# Altium footprint library MU_MP_39_V1.PcbLib: 76 footprints (part 2 of 5)
Each footprint in its own frame and in the unit in brackets; x right, y up, seen from the top. Pads: shape width x height; smd on the part's side, far side on the other; paste and mask are expansions set on the pad; w line width, h text height; cw(c..) or ccw(c..) is an arc to the next point about the centre after c.
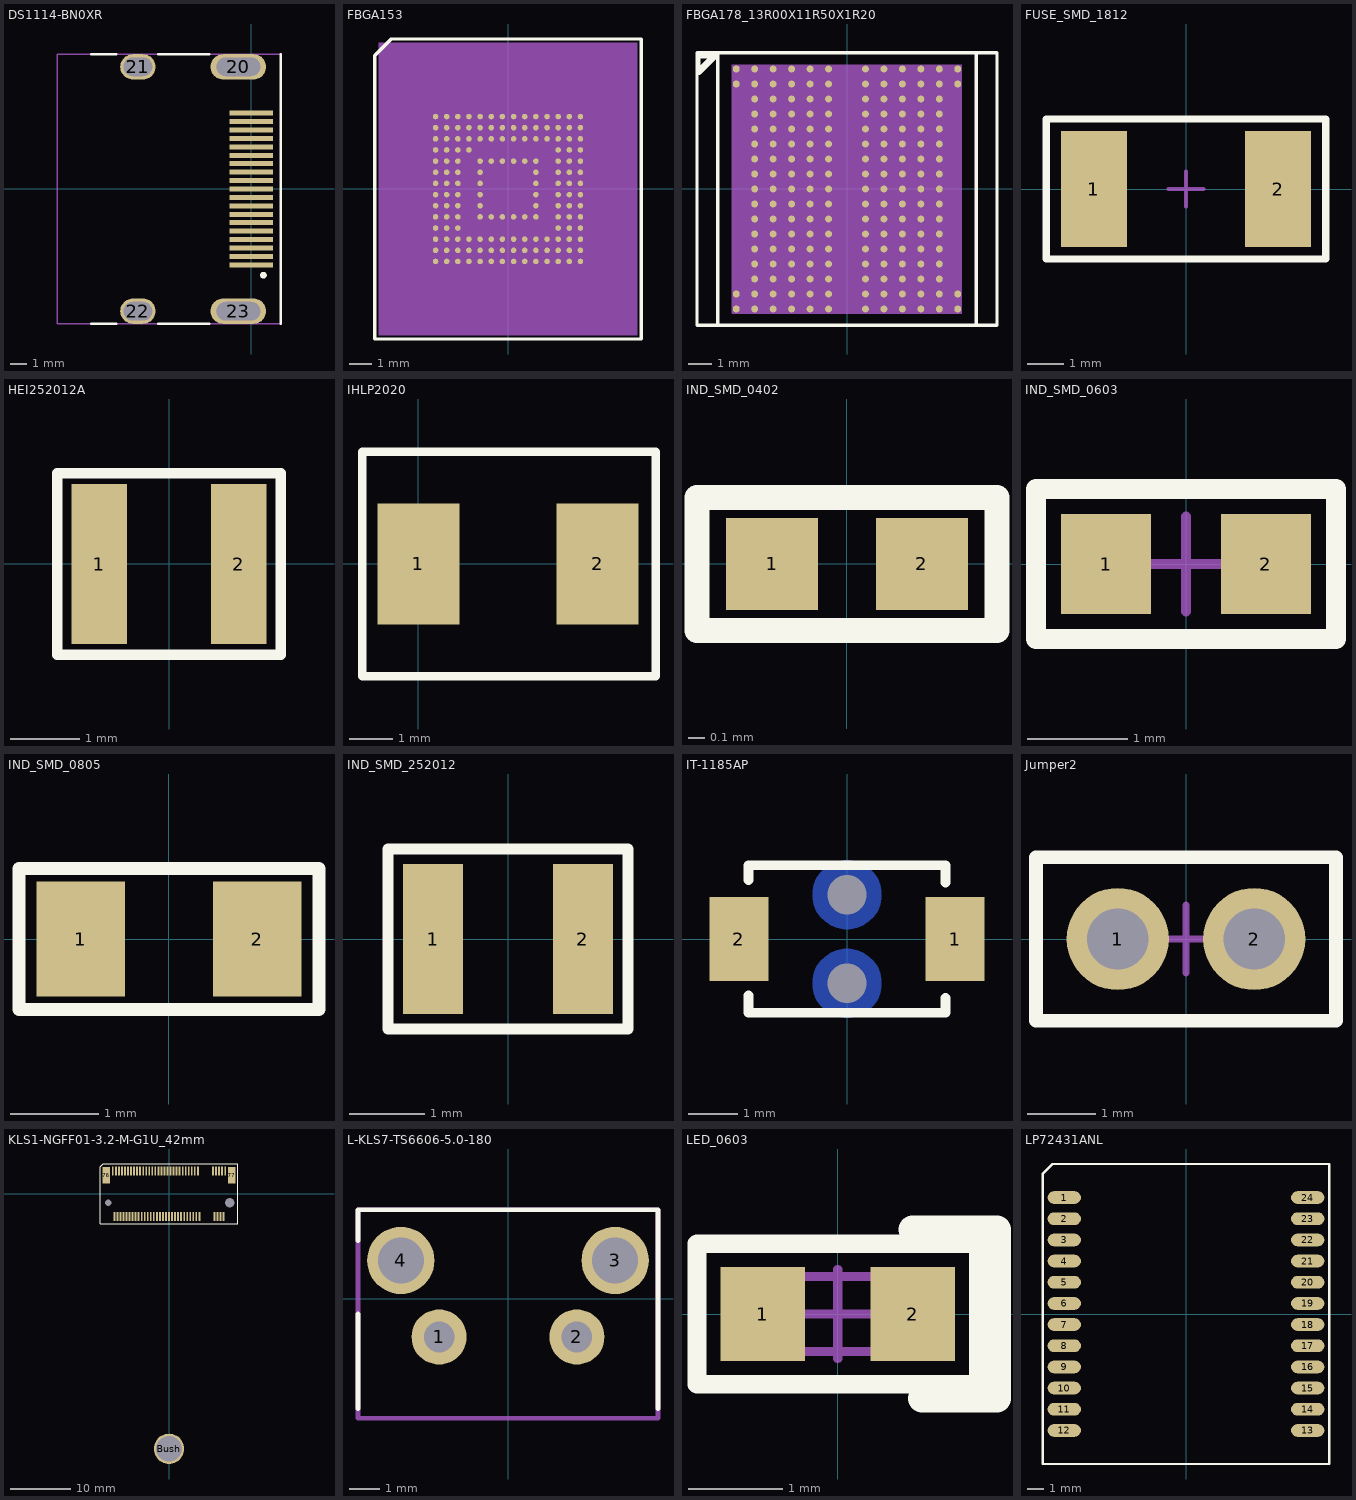
[diagram p1: the footprints below, top view; thin cyan lines are the x and y axes]

## DS1114-BN0XR [mm]
pads (23):
  rect 2.6x0.3 smd: 1(0,-4.5) 2(0,-4) 3(0,-3.5) 4(0,-3) 5(0,-2.5) 6(0,-2) 7(0,-1.5) 8(0,-1) 9(0,-0.5) 10(0,0) 11(0,0.5) 12(0,1) 13(0,1.5) 14(0,2) 15(0,2.5) 16(0,3) 17(0,3.5) 18(0,4) 19(0,4.5)
  oval 3.3x1.5 hole 1.1 slot 2.6 at 0 deg: 20(-0.76,7.25) 23(-0.76,-7.25)
  oval 2.1x1.5 hole 1.1 slot 1.7 at 0 deg: 21(-6.72,7.25) 22(-6.72,-7.25)
Top Overlay:
  circle w0.2: c0.725,-5.115 r0.1
  lines w0.15: -9.5,-8 -8,-8 ; -9.5,8 -8,8 ; -5.5,-8 -2.5,-8 ; -5.5,8 -2.5,8 ; 1.75,-8 1.75,8
Top Solder:
  rectangle: -1.4,-4.715 1.4,4.7
Mechanical 15:
  lines w0.1: -11.5,-8 -11.5,8 1.75,8 1.75,-8 -11.5,-8
3D body "HDMI.STEP": height 6.23, standoff -2.15, extent -11.325,-7.5 0.825,7.5

## FBGA153 [mm]
pads (153):
  round 0.25 smd: A1(-3.25,3.25) A2(-2.75,3.25) A3(-2.25,3.25) A4(-1.75,3.25) A5(-1.25,3.25) A6(-0.75,3.25) A7(-0.25,3.25) A8(0.25,3.25) A9(0.75,3.25) A10(1.25,3.25) A11(1.75,3.25) A12(2.25,3.25) A13(2.75,3.25) A14(3.25,3.25) B1(-3.25,2.75) B2(-2.75,2.75) B3(-2.25,2.75) B4(-1.75,2.75) B5(-1.25,2.75) B6(-0.75,2.75) B7(-0.25,2.75) B8(0.25,2.75) B9(0.75,2.75) B10(1.25,2.75) B11(1.75,2.75) B12(2.25,2.75) B13(2.75,2.75) B14(3.25,2.75) C1(-3.25,2.25) C2(-2.75,2.25) C3(-2.25,2.25) C4(-1.75,2.25) C5(-1.25,2.25) C6(-0.75,2.25) C7(-0.25,2.25) C8(0.25,2.25) C9(0.75,2.25) C10(1.25,2.25) C11(1.75,2.25) C12(2.25,2.25) C13(2.75,2.25) C14(3.25,2.25) D1(-3.25,1.75) D2(-2.75,1.75) D3(-2.25,1.75) D4(-1.75,1.75) D12(2.25,1.75) D13(2.75,1.75) D14(3.25,1.75) E1(-3.25,1.25) E2(-2.75,1.25) E3(-2.25,1.25) E5(-1.25,1.25) E6(-0.75,1.25) E7(-0.25,1.25) E8(0.25,1.25) E9(0.75,1.25) E10(1.25,1.25) E12(2.25,1.25) E13(2.75,1.25) E14(3.25,1.25) F1(-3.25,0.75) F2(-2.75,0.75) F3(-2.25,0.75) F5(-1.25,0.75) F10(1.25,0.75) F12(2.25,0.75) F13(2.75,0.75) F14(3.25,0.75) G1(-3.25,0.25) G2(-2.75,0.25) G3(-2.25,0.25) G5(-1.25,0.25) G10(1.25,0.25) G12(2.25,0.25) G13(2.75,0.25) G14(3.25,0.25) H1(-3.25,-0.25) H2(-2.75,-0.25) H3(-2.25,-0.25) H5(-1.25,-0.25) H10(1.25,-0.25) H12(2.25,-0.25) H13(2.75,-0.25) H14(3.25,-0.25) J1(-3.25,-0.75) J2(-2.75,-0.75) J3(-2.25,-0.75) J5(-1.25,-0.75) J10(1.25,-0.75) J12(2.25,-0.75) J13(2.75,-0.75) J14(3.25,-0.75) K1(-3.25,-1.25) K2(-2.75,-1.25) K3(-2.25,-1.25) K5(-1.25,-1.25) K6(-0.75,-1.25) K7(-0.25,-1.25) K8(0.25,-1.25) K9(0.75,-1.25) K10(1.25,-1.25) K12(2.25,-1.25) K13(2.75,-1.25) K14(3.25,-1.25) L1(-3.25,-1.75) L2(-2.75,-1.75) L3(-2.25,-1.75) L12(2.25,-1.75) L13(2.75,-1.75) L14(3.25,-1.75) M1(-3.25,-2.25) M2(-2.75,-2.25) M3(-2.25,-2.25) M4(-1.75,-2.25) M5(-1.25,-2.25) M6(-0.75,-2.25) M7(-0.25,-2.25) M8(0.25,-2.25) M9(0.75,-2.25) M10(1.25,-2.25) M11(1.75,-2.25) M12(2.25,-2.25) M13(2.75,-2.25) M14(3.25,-2.25) N1(-3.25,-2.75) N2(-2.75,-2.75) N3(-2.25,-2.75) N4(-1.75,-2.75) N5(-1.25,-2.75) N6(-0.75,-2.75) N7(-0.25,-2.75) N8(0.25,-2.75) N9(0.75,-2.75) N10(1.25,-2.75) N11(1.75,-2.75) N12(2.25,-2.75) N13(2.75,-2.75) N14(3.25,-2.75) P1(-3.25,-3.25) P2(-2.75,-3.25) P3(-2.25,-3.25) P4(-1.75,-3.25) P5(-1.25,-3.25) P6(-0.75,-3.25) P7(-0.25,-3.25) P8(0.25,-3.25) P9(0.75,-3.25) P10(1.25,-3.25) P11(1.75,-3.25) P12(2.25,-3.25) P13(2.75,-3.25) P14(3.25,-3.25)
Top Overlay:
  lines w0.152: -5.978,-6.728 5.978,-6.728 5.978,6.599 5.978,6.728 -5.238,6.728 -5.978,5.989 -5.978,-6.728
Mechanical 5:
  dashed: -5.8,-6.55 5.8,-6.55 5.8,6.55 -5.8,6.55
Mechanical 30:
  text "J5" at -1.047,-0.75 h0.7
  text "H5" at -1.047,-0.25 h0.7
  text "A6" at -0.547,3.25 h0.7
  text "B2" at -2.547,2.75 h0.7
  text "C6" at -0.547,2.25 h0.7
  text "P5" at -1.047,-3.25 h0.7
  text "P3" at -2.047,-3.25 h0.7
  text "M4" at -1.547,-2.25 h0.7
  text "N4" at -1.547,-2.75 h0.7
  text "B4" at -1.547,2.75 h0.7
  text "K5" at -1.047,-1.25 h0.7
  text "A4" at -1.547,3.25 h0.7
  text "A5" at -1.047,3.25 h0.7
  text "A3" at -2.047,3.25 h0.7
  text "B6" at -0.547,2.75 h0.7
  text "K9" at 0.953,-1.25 h0.7
  text "J10" at 1.555,-0.75 h0.7
  text "F5" at -1.047,0.75 h0.7
  text "E6" at -0.547,1.25 h0.7
  text "B3" at -2.047,2.75 h0.7
  text "B5" at -1.047,2.75 h0.7
  text "C2" at -2.547,2.25 h0.7
  text "M5" at -1.047,-2.25 h0.7
  text "M6" at -0.547,-2.25 h0.7
  text "A1" at -3.047,3.25 h0.7
  text "A10" at 1.555,3.25 h0.7
  text "A11" at 2.055,3.25 h0.7
  text "A12" at 2.555,3.25 h0.7
  text "A13" at 3.055,3.25 h0.7
  text "A14" at 3.555,3.25 h0.7
  text "A2" at -2.547,3.25 h0.7
  text "A8" at 0.453,3.25 h0.7
  text "A9" at 0.953,3.25 h0.7
  text "B1" at -3.047,2.75 h0.7
  text "B10" at 1.555,2.75 h0.7
  text "B11" at 2.055,2.75 h0.7
  text "B12" at 2.555,2.75 h0.7
  text "B13" at 3.055,2.75 h0.7
  text "B14" at 3.555,2.75 h0.7
  text "B7" at -0.047,2.75 h0.7
  text "B8" at 0.453,2.75 h0.7
  text "B9" at 0.953,2.75 h0.7
  text "C1" at -3.047,2.25 h0.7
  text "C10" at 1.555,2.25 h0.7
  text "C11" at 2.055,2.25 h0.7
  text "C12" at 2.555,2.25 h0.7
  text "C13" at 3.055,2.25 h0.7
  text "C14" at 3.555,2.25 h0.7
  text "C3" at -2.047,2.25 h0.7
  text "C7" at -0.047,2.25 h0.7
  text "C8" at 0.453,2.25 h0.7
  text "C9" at 0.953,2.25 h0.7
  text "D1" at -3.047,1.75 h0.7
  text "D12" at 2.555,1.75 h0.7
  text "D13" at 3.055,1.75 h0.7
  text "D14" at 3.555,1.75 h0.7
  text "D2" at -2.547,1.75 h0.7
  text "D3" at -2.047,1.75 h0.7
  text "D4" at -1.547,1.75 h0.7
  text "E1" at -3.047,1.25 h0.7
  text "E12" at 2.555,1.25 h0.7
  text "E13" at 3.055,1.25 h0.7
  text "E14" at 3.555,1.25 h0.7
  text "E2" at -2.547,1.25 h0.7
  text "E3" at -2.047,1.25 h0.7
  text "F1" at -3.047,0.75 h0.7
  text "F12" at 2.555,0.75 h0.7
  text "F13" at 3.055,0.75 h0.7
  text "F14" at 3.555,0.75 h0.7
  text "F2" at -2.547,0.75 h0.7
  text "F3" at -2.047,0.75 h0.7
  text "G1" at -3.047,0.25 h0.7
  text "G12" at 2.555,0.25 h0.7
  text "G13" at 3.055,0.25 h0.7
  text "G14" at 3.555,0.25 h0.7
  text "G2" at -2.547,0.25 h0.7
  text "H1" at -3.047,-0.25 h0.7
  text "H12" at 2.555,-0.25 h0.7
  text "H13" at 3.055,-0.25 h0.7
  text "H14" at 3.555,-0.25 h0.7
  text "H2" at -2.547,-0.25 h0.7
  text "H3" at -2.047,-0.25 h0.7
  text "J1" at -3.047,-0.75 h0.7
  text "J12" at 2.555,-0.75 h0.7
  text "J13" at 3.055,-0.75 h0.7
  text "J14" at 3.555,-0.75 h0.7
  text "J2" at -2.547,-0.75 h0.7
  text "J3" at -2.047,-0.75 h0.7
  text "K1" at -3.047,-1.25 h0.7
  text "K12" at 2.555,-1.25 h0.7
  text "K13" at 3.055,-1.25 h0.7
  text "K14" at 3.555,-1.25 h0.7
  text "K2" at -2.547,-1.25 h0.7
  text "K3" at -2.047,-1.25 h0.7
  text "L1" at -3.047,-1.75 h0.7
  text "L12" at 2.555,-1.75 h0.7
  text "L13" at 3.055,-1.75 h0.7
  text "L14" at 3.555,-1.75 h0.7
  text "L2" at -2.547,-1.75 h0.7
  text "L3" at -2.047,-1.75 h0.7
  text "M1" at -3.047,-2.25 h0.7
  text "M10" at 1.555,-2.25 h0.7
  text "M11" at 2.055,-2.25 h0.7
  text "M12" at 2.555,-2.25 h0.7
  text "M13" at 3.055,-2.25 h0.7
  text "M14" at 3.555,-2.25 h0.7
  text "M2" at -2.547,-2.25 h0.7
  text "M3" at -2.047,-2.25 h0.7
  text "M7" at -0.047,-2.25 h0.7
  text "M8" at 0.453,-2.25 h0.7
  text "M9" at 0.953,-2.25 h0.7
  text "N1" at -3.047,-2.75 h0.7
  text "N10" at 1.555,-2.75 h0.7
  text "N11" at 2.055,-2.75 h0.7
  text "N12" at 2.555,-2.75 h0.7
  text "N13" at 3.055,-2.75 h0.7
  text "N14" at 3.555,-2.75 h0.7
  text "N3" at -2.047,-2.75 h0.7
  text "N6" at -0.547,-2.75 h0.7
  text "N7" at -0.047,-2.75 h0.7
  text "N8" at 0.453,-2.75 h0.7
  text "N9" at 0.953,-2.75 h0.7
  text "P1" at -3.047,-3.25 h0.7
  text "P11" at 2.055,-3.25 h0.7
  text "P12" at 2.555,-3.25 h0.7
  text "P13" at 3.055,-3.25 h0.7
  text "P14" at 3.555,-3.25 h0.7
  text "P2" at -2.547,-3.25 h0.7
  text "P8" at 0.453,-3.25 h0.7
  text "P9" at 0.953,-3.25 h0.7
  text "G3" at -2.047,0.25 h0.7
  text "K10" at 1.555,-1.25 h0.7
  text "K6" at -0.547,-1.25 h0.7
  text "K7" at -0.047,-1.25 h0.7
  text "P10" at 1.555,-3.25 h0.7
  text "P7" at -0.047,-3.25 h0.7
  text "A7" at -0.047,3.25 h0.7
  text "C5" at -1.047,2.25 h0.7
  text "E10" at 1.555,1.25 h0.7
  text "E5" at -1.047,1.25 h0.7
  text "E8" at 0.453,1.25 h0.7
  text "E9" at 0.953,1.25 h0.7
  text "F10" at 1.555,0.75 h0.7
  text "G10" at 1.555,0.25 h0.7
  text "G5" at -1.047,0.25 h0.7
  text "E7" at -0.047,1.25 h0.7
  text "K8" at 0.453,-1.25 h0.7
  text "H10" at 1.555,-0.25 h0.7
  text "C4" at -1.547,2.25 h0.7
  text "P6" at -0.547,-3.25 h0.7
  text "N5" at -1.047,-2.75 h0.7
  text "P4" at -1.547,-3.25 h0.7
  text "N2" at -2.547,-2.75 h0.7
3D body "User Library-153BallWFBGA.STEP": height 0.78, standoff -0.02, extent -5.75,-6.471 5.75,6.529

## FBGA178_13R00X11R50X1R20 [mm]
pads (178):
  round 0.3 smd: A1(-4.8,5.2) A2(-4,5.2) A3(-3.2,5.2) A4(-2.4,5.2) A5(-1.6,5.2) A6(-0.8,5.2) A8(0.8,5.2) A9(1.6,5.2) A10(2.4,5.2) A11(3.2,5.2) A12(4,5.2) A13(4.8,5.2) B1(-4.8,4.55) B2(-4,4.55) B3(-3.2,4.55) B4(-2.4,4.55) B5(-1.6,4.55) B6(-0.8,4.55) B8(0.8,4.55) B9(1.6,4.55) B10(2.4,4.55) B11(3.2,4.55) B12(4,4.55) B13(4.8,4.55) C2(-4,3.9) C3(-3.2,3.9) C4(-2.4,3.9) C5(-1.6,3.9) C6(-0.8,3.9) C8(0.8,3.9) C9(1.6,3.9) C10(2.4,3.9) C11(3.2,3.9) C12(4,3.9) D2(-4,3.25) D3(-3.2,3.25) D4(-2.4,3.25) D5(-1.6,3.25) D6(-0.8,3.25) D8(0.8,3.25) D9(1.6,3.25) D10(2.4,3.25) D11(3.2,3.25) D12(4,3.25) E2(-4,2.6) E3(-3.2,2.6) E4(-2.4,2.6) E5(-1.6,2.6) E6(-0.8,2.6) E8(0.8,2.6) E9(1.6,2.6) E10(2.4,2.6) E11(3.2,2.6) E12(4,2.6) F2(-4,1.95) F3(-3.2,1.95) F4(-2.4,1.95) F5(-1.6,1.95) F6(-0.8,1.95) F8(0.8,1.95) F9(1.6,1.95) F10(2.4,1.95) F11(3.2,1.95) F12(4,1.95) G2(-4,1.3) G3(-3.2,1.3) G4(-2.4,1.3) G5(-1.6,1.3) G6(-0.8,1.3) G8(0.8,1.3) G9(1.6,1.3) G10(2.4,1.3) G11(3.2,1.3) G12(4,1.3) H2(-4,0.65) H3(-3.2,0.65) H4(-2.4,0.65) H5(-1.6,0.65) H6(-0.8,0.65) H8(0.8,0.65) H9(1.6,0.65) H10(2.4,0.65) H11(3.2,0.65) H12(4,0.65) J2(-4,0) J3(-3.2,0) J4(-2.4,0) J5(-1.6,0) J6(-0.8,0) J8(0.8,0) J9(1.6,0) J10(2.4,0) J11(3.2,0) J12(4,0) K2(-4,-0.65) K3(-3.2,-0.65) K4(-2.4,-0.65) K5(-1.6,-0.65) K6(-0.8,-0.65) K8(0.8,-0.65) K9(1.6,-0.65) K10(2.4,-0.65) K11(3.2,-0.65) K12(4,-0.65) L2(-4,-1.3) L3(-3.2,-1.3) L4(-2.4,-1.3) L5(-1.6,-1.3) L6(-0.8,-1.3) L8(0.8,-1.3) L9(1.6,-1.3) L10(2.4,-1.3) L11(3.2,-1.3) L12(4,-1.3) M2(-4,-1.95) M3(-3.2,-1.95) M4(-2.4,-1.95) M5(-1.6,-1.95) M6(-0.8,-1.95) M8(0.8,-1.95) M9(1.6,-1.95) M10(2.4,-1.95) M11(3.2,-1.95) M12(4,-1.95) N2(-4,-2.6) N3(-3.2,-2.6) N4(-2.4,-2.6) N5(-1.6,-2.6) N6(-0.8,-2.6) N8(0.8,-2.6) N9(1.6,-2.6) N10(2.4,-2.6) N11(3.2,-2.6) N12(4,-2.6) P2(-4,-3.25) P3(-3.2,-3.25) P4(-2.4,-3.25) P5(-1.6,-3.25) P6(-0.8,-3.25) P8(0.8,-3.25) P9(1.6,-3.25) P10(2.4,-3.25) P11(3.2,-3.25) P12(4,-3.25) R2(-4,-3.9) R3(-3.2,-3.9) R4(-2.4,-3.9) R5(-1.6,-3.9) R6(-0.8,-3.9) R8(0.8,-3.9) R9(1.6,-3.9) R10(2.4,-3.9) R11(3.2,-3.9) R12(4,-3.9) T1(-4.8,-4.55) T2(-4,-4.55) T3(-3.2,-4.55) T4(-2.4,-4.55) T5(-1.6,-4.55) T6(-0.8,-4.55) T8(0.8,-4.55) T9(1.6,-4.55) T10(2.4,-4.55) T11(3.2,-4.55) T12(4,-4.55) T13(4.8,-4.55) U1(-4.8,-5.2) U2(-4,-5.2) U3(-3.2,-5.2) U4(-2.4,-5.2) U5(-1.6,-5.2) U6(-0.8,-5.2) U8(0.8,-5.2) U9(1.6,-5.2) U10(2.4,-5.2) U11(3.2,-5.2) U12(4,-5.2) U13(4.8,-5.2)
Top Overlay:
  lines w0.15: -6.416,5.084 -6.416,5.632 ; -5.6,-5.9 -5.6,5.9 ; 5.6,-5.9 5.6,5.9 ; -6.5,-5.9 -6.5,5.9 6.5,5.9 6.5,-5.9 -6.5,-5.9
  lines w0.3: -6.416,5.084 -5.7,5.8 -6.411,5.8
Mechanical 7:
  text "D10" at 2.4,4.012 h0.7
  text "D11" at 3.2,4.012 h0.7
  text "P10" at 2.4,-2.488 h0.7
  text "P11" at 3.2,-2.488 h0.7
  text "G10" at 2.4,2.062 h0.7
  text "G11" at 3.2,2.062 h0.7
  text "L10" at 2.4,-0.538 h0.7
  text "L11" at 3.2,-0.538 h0.7
  text "D8" at 0.8,3.758 h0.7
  text "P8" at 0.8,-2.742 h0.7
  text "G8" at 0.8,1.808 h0.7
  text "L8" at 0.8,-0.792 h0.7
  text "F10" at 2.4,2.712 h0.7
  text "F11" at 3.2,2.712 h0.7
  text "M11" at 3.2,-1.188 h0.7
  text "M10" at 2.4,-1.188 h0.7
  text "M9" at 1.6,-1.442 h0.7
  text "M8" at 0.8,-1.442 h0.7
  text "B8" at 0.8,5.058 h0.7
  text "B9" at 1.6,5.058 h0.7
  text "N11" at 3.2,-1.838 h0.7
  text "B10" at 2.4,5.312 h0.7
  text "B11" at 3.2,5.312 h0.7
  text "C8" at 0.8,4.408 h0.7
  text "C9" at 1.6,4.408 h0.7
  text "C10" at 2.4,4.662 h0.7
  text "C11" at 3.2,4.662 h0.7
  text "R11" at 3.2,-3.138 h0.7
  text "R10" at 2.4,-3.138 h0.7
  text "R9" at 1.6,-3.392 h0.7
  text "R8" at 0.8,-3.392 h0.7
  text "N10" at 2.4,-1.838 h0.7
  text "T11" at 3.2,-3.788 h0.7
  text "T9" at 1.6,-4.042 h0.7
  text "D9" at 1.6,3.758 h0.7
  text "E9" at 1.6,3.108 h0.7
  text "E10" at 2.4,3.362 h0.7
  text "E11" at 3.2,3.362 h0.7
  text "F8" at 0.8,2.458 h0.7
  text "F9" at 1.6,2.458 h0.7
  text "N9" at 1.6,-2.092 h0.7
  text "P9" at 1.6,-2.742 h0.7
  text "C2" at -4,4.408 h0.7
  text "D2" at -4,3.758 h0.7
  text "E2" at -4,3.108 h0.7
  text "E3" at -3.2,3.108 h0.7
  text "F3" at -3.2,2.458 h0.7
  text "N3" at -3.2,-2.092 h0.7
  text "N2" at -4,-2.092 h0.7
  text "P2" at -4,-2.742 h0.7
  text "R2" at -4,-3.392 h0.7
  text "T10" at 2.4,-3.788 h0.7
  text "T8" at 0.8,-4.042 h0.7
  text "J8" at 0.8,0.508 h0.7
  text "L4" at -2.4,-0.792 h0.7
  text "L3" at -3.2,-0.792 h0.7
  text "K4" at -2.4,-0.142 h0.7
  text "K3" at -3.2,-0.142 h0.7
  text "M3" at -3.2,-1.442 h0.7
  text "J11" at 3.2,0.762 h0.7
  text "T12" at 4,-3.788 h0.7
  text "B12" at 4,5.312 h0.7
  text "D12" at 4,4.012 h0.7
  text "J12" at 4,0.762 h0.7
  text "M12" at 4,-1.188 h0.7
  text "T2" at -4,-4.042 h0.7
  text "H2" at -4,1.158 h0.7
  text "P12" at 4,-2.488 h0.7
  text "F12" at 4,2.712 h0.7
  text "K10" at 2.4,0.112 h0.7
  text "L9" at 1.6,-0.792 h0.7
  text "R6" at -0.8,-3.392 h0.7
  text "T3" at -3.2,-4.042 h0.7
  text "T6" at -0.8,-4.042 h0.7
  text "R4" at -2.4,-3.392 h0.7
  text "T4" at -2.4,-4.042 h0.7
  text "T5" at -1.6,-4.042 h0.7
  text "R5" at -1.6,-3.392 h0.7
  text "K2" at -4,-0.142 h0.7
  text "J4" at -2.4,0.508 h0.7
  text "C5" at -1.6,4.408 h0.7
  text "B5" at -1.6,5.058 h0.7
  text "B6" at -0.8,5.058 h0.7
  text "C6" at -0.8,4.408 h0.7
  text "H10" at 2.4,1.412 h0.7
  text "G9" at 1.6,1.808 h0.7
  text "E6" at -0.8,3.108 h0.7
  text "G6" at -0.8,1.808 h0.7
  text "F6" at -0.8,2.458 h0.7
  text "F4" at -2.4,2.458 h0.7
  text "E4" at -2.4,3.108 h0.7
  text "G4" at -2.4,1.808 h0.7
  text "G3" at -3.2,1.808 h0.7
  text "C3" at -3.2,4.408 h0.7
  text "D3" at -3.2,3.758 h0.7
  text "B2" at -4,5.058 h0.7
  text "F5" at -1.6,2.458 h0.7
  text "E5" at -1.6,3.108 h0.7
  text "M6" at -0.8,-1.442 h0.7
  text "N6" at -0.8,-2.092 h0.7
  text "L6" at -0.8,-0.792 h0.7
  text "M5" at -1.6,-1.442 h0.7
  text "N5" at -1.6,-2.092 h0.7
  text "M4" at -2.4,-1.442 h0.7
  text "N4" at -2.4,-2.092 h0.7
  text "P3" at -3.2,-2.742 h0.7
  text "J2" at -4,0.508 h0.7
  text "J3" at -3.2,0.508 h0.7
  text "U1" at -4.8,-4.692 h0.7
  text "T13" at 4.8,-3.788 h0.7
  text "T1" at -4.8,-4.042 h0.7
  text "B13" at 4.8,5.312 h0.7
  text "B1" at -4.8,5.058 h0.7
  text "A13" at 4.8,5.962 h0.7
  text "A12" at 4,5.962 h0.7
  text "A2" at -4,5.708 h0.7
  text "U13" at 4.8,-4.438 h0.7
  text "U12" at 4,-4.438 h0.7
  text "U2" at -4,-4.692 h0.7
  text "A1" at -4.8,5.708 h0.7
  text "R3" at -3.2,-3.392 h0.7
  text "K9" at 1.6,-0.142 h0.7
  text "C4" at -2.4,4.408 h0.7
  text "U8" at 0.8,-4.692 h0.7
  text "H12" at 4,1.412 h0.7
  text "K12" at 4,0.112 h0.7
  text "A8" at 0.8,5.708 h0.7
  text "A9" at 1.6,5.708 h0.7
  text "U9" at 1.6,-4.692 h0.7
  text "J5" at -1.6,0.508 h0.7
  text "H6" at -0.8,1.158 h0.7
  text "J6" at -0.8,0.508 h0.7
  text "H5" at -1.6,1.158 h0.7
  text "G5" at -1.6,1.808 h0.7
  text "H3" at -3.2,1.158 h0.7
  text "F2" at -4,2.458 h0.7
  text "G2" at -4,1.808 h0.7
  text "L2" at -4,-0.792 h0.7
  text "M2" at -4,-1.442 h0.7
  text "P5" at -1.6,-2.742 h0.7
  text "P6" at -0.8,-2.742 h0.7
  text "P4" at -2.4,-2.742 h0.7
  text "D5" at -1.6,3.758 h0.7
  text "D6" at -0.8,3.758 h0.7
  text "D4" at -2.4,3.758 h0.7
  text "K5" at -1.6,-0.142 h0.7
  text "L5" at -1.6,-0.792 h0.7
  text "K6" at -0.8,-0.142 h0.7
  text "B4" at -2.4,5.058 h0.7
  text "B3" at -3.2,5.058 h0.7
  text "H4" at -2.4,1.158 h0.7
  text "R12" at 4,-3.138 h0.7
  text "N12" at 4,-1.838 h0.7
  text "U11" at 3.2,-4.438 h0.7
  text "N8" at 0.8,-2.092 h0.7
  text "G12" at 4,2.062 h0.7
  text "E12" at 4,3.362 h0.7
  text "C12" at 4,4.662 h0.7
  text "A11" at 3.2,5.962 h0.7
  text "E8" at 0.8,3.108 h0.7
  text "H8" at 0.8,1.158 h0.7
  text "J9" at 1.6,0.508 h0.7
  text "H9" at 1.6,1.158 h0.7
  text "K8" at 0.8,-0.142 h0.7
  text "J10" at 2.4,0.762 h0.7
  text "H11" at 3.2,1.412 h0.7
  text "L12" at 4,-0.538 h0.7
  text "K11" at 3.2,0.112 h0.7
  text "A5" at -1.6,5.708 h0.7
  text "A4" at -2.4,5.708 h0.7
  text "U6" at -0.8,-4.692 h0.7
  text "U5" at -1.6,-4.692 h0.7
  text "U4" at -2.4,-4.692 h0.7
  text "U10" at 2.4,-4.438 h0.7
  text "A10" at 2.4,5.962 h0.7
  text "U3" at -3.2,-4.692 h0.7
  text "A6" at -0.8,5.708 h0.7
  text "A3" at -3.2,5.708 h0.7
Mechanical 12:
  lines w0.025: -4.975,-5.375 -4.975,5.375 4.975,5.375 4.975,-5.375 -4.975,-5.375
  text ".Designator" at -3.048,-0.508 h0.7
  text "K4E8E304EE-EGCE" at 0,0 h0.7
Mechanical 13:
  region: -4.975,-5.375 4.975,-5.375 4.975,5.375 -4.975,5.375
3D body "User Library-FBGA-178.STEP": height 0.93, standoff 0, extent -5.5,-5.73 5.5,5.77

## FUSE_SMD_1812 [mm]
pads (2):
  rect 1.8x3.15 smd: 1(-2.5,0) 2(2.5,0)
Top Overlay:
  lines w0.2: -3.8,-1.9 3.8,-1.9 3.8,1.9 -3.8,1.9 -3.8,-1.9
Mechanical 15:
  lines w0.1: -0.475,0 0.475,0 ; 0,-0.475 0,0.475 ; -3.8,-1.9 -3.8,1.9 3.8,1.9 3.8,-1.9 -3.8,-1.9
3D body "User Library-1812L.STEP": height 1.34, standoff 0, extent -2.365,-1.705 2.365,1.705

## HEI252012A [mm]
pads (2):
  rect 0.8x2.3 smd: 1(-1,0) 2(1,0)
Top Overlay:
  lines w0.15: -1.6,-1.3 -1.6,1.3 1.6,1.3 1.6,-1.3 -1.6,-1.3
3D body "User Library-SWPA252010.STEP": height 1.07, standoff 0, extent -1.25,-1 1.25,1

## IHLP2020 [mm]
pads (2):
  rect 1.9x2.8 smd: 1(0,0) 2(4.15,0)
Top Overlay:
  lines w0.2: -1.3,-2.6 -1.3,2.6 5.5,2.6 5.5,-2.6 -1.3,-2.6
Mechanical 15:
  lines w0.1: -1.3,-2.6 5.5,-2.6 5.5,2.6 -1.3,2.6 -1.3,-2.6
3D body "User Library-IHLP-2020BZ-01.STEP": height 2, standoff 0, extent -0.69,-2.6 4.8,2.58

## IND_SMD_0402 [mm]
pads (2):
  rect 0.55x0.55 smd: 1(-0.45,0) 2(0.45,0)
Top Overlay:
  lines w0.15: -0.9,-0.4 -0.9,0.4 0.9,0.4 0.9,0.3 0.9,-0.4 -0.9,-0.4
3D body "User Library-FB_1005.STEP": height 0.5, standoff 0, extent -0.5,-0.25 0.5,0.25

## IND_SMD_0603 [mm]
pads (2):
  rect 0.9x1 smd: 1(-0.8,0) 2(0.8,0)
Top Overlay:
  lines w0.2: -1.5,-0.75 1.5,-0.75 1.5,0.75 -1.5,0.75 -1.5,-0.75
Mechanical 1:
  lines w0.1: -1.5,-0.75 1.5,-0.75 1.5,0.75 -1.5,0.75 -1.5,-0.75
Mechanical 15:
  lines w0.1: -0.475,0 0.475,0 ; 0,-0.475 0,0.475 ; -1.5,-0.75 -1.5,0.75 1.5,0.75 1.5,-0.75 -1.5,-0.75
3D body "User Library-FB_1608-1.STEP": height 0.8, standoff 0, extent -0.8,-0.4 0.8,0.4

## IND_SMD_0805 [mm]
pads (2):
  rect 1x1.3 smd: 1(-1,0) 2(1,0)
Top Overlay:
  lines w0.15: -1.7,-0.8 -1.7,0.8 1.7,0.8 1.7,-0.8 -1.7,-0.8
3D body "User Library-FB_2012-1.STEP": height 0.85, standoff 0, extent -1.003,-0.622 0.997,0.628

## IND_SMD_252012 [mm]
pads (2):
  rect 0.8x2 smd: 1(-1,0) 2(1,0)
Top Overlay:
  lines w0.15: -1.6,-1.2 -1.6,1.2 1.6,1.2 1.6,-1.2 -1.6,-1.2
3D body "DFE252012P-1R5M=P2.STEP": height 1.2, standoff 0, extent -1.25,-1 1.25,1

## IT-1185AP [mm]
pads (4):
  rect 1.2x1.7 smd: 1(2.2,0) 2(-2.2,0)
  round 0 hole 0.8 unplated: ""(0,-0.9) ""(0,0.9)
Mid-Layer 1:
  pour cut-out: 0,-1.6 -0.069,-1.6 -0.204,-1.573 -0.332,-1.52 -0.446,-1.444 -0.544,-1.346 -0.62,-1.232 -0.673,-1.104 -0.7,-0.969 -0.7,-0.9 -0.7,-0.831 -0.673,-0.696 -0.62,-0.568 -0.544,-0.454 -0.446,-0.356 -0.332,-0.28 -0.204,-0.227 -0.069,-0.2 0,-0.2 0.069,-0.2 0.204,-0.227 0.332,-0.28 0.446,-0.356 0.544,-0.454 0.62,-0.568 0.673,-0.696 0.7,-0.831 0.7,-0.9 0.7,-0.969 0.673,-1.104 0.62,-1.232 0.544,-1.346 0.446,-1.444 0.332,-1.52 0.204,-1.573 0.069,-1.6
  pour cut-out: 0,0.2 -0.069,0.2 -0.204,0.227 -0.332,0.28 -0.446,0.356 -0.544,0.454 -0.62,0.568 -0.673,0.696 -0.7,0.831 -0.7,0.9 -0.7,0.969 -0.673,1.104 -0.62,1.232 -0.544,1.346 -0.446,1.444 -0.332,1.52 -0.204,1.573 -0.069,1.6 0,1.6 0.069,1.6 0.204,1.573 0.332,1.52 0.446,1.444 0.544,1.346 0.62,1.232 0.673,1.104 0.7,0.969 0.7,0.9 0.7,0.831 0.673,0.696 0.62,0.568 0.544,0.454 0.446,0.356 0.332,0.28 0.204,0.227 0.069,0.2
Mid-Layer 3:
  pour cut-out: 0,-1.6 -0.069,-1.6 -0.204,-1.573 -0.332,-1.52 -0.446,-1.444 -0.544,-1.346 -0.62,-1.232 -0.673,-1.104 -0.7,-0.969 -0.7,-0.9 -0.7,-0.831 -0.673,-0.696 -0.62,-0.568 -0.544,-0.454 -0.446,-0.356 -0.332,-0.28 -0.204,-0.227 -0.069,-0.2 0,-0.2 0.069,-0.2 0.204,-0.227 0.332,-0.28 0.446,-0.356 0.544,-0.454 0.62,-0.568 0.673,-0.696 0.7,-0.831 0.7,-0.9 0.7,-0.969 0.673,-1.104 0.62,-1.232 0.544,-1.346 0.446,-1.444 0.332,-1.52 0.204,-1.573 0.069,-1.6
  pour cut-out: 0,0.2 -0.069,0.2 -0.204,0.227 -0.332,0.28 -0.446,0.356 -0.544,0.454 -0.62,0.568 -0.673,0.696 -0.7,0.831 -0.7,0.9 -0.7,0.969 -0.673,1.104 -0.62,1.232 -0.544,1.346 -0.446,1.444 -0.332,1.52 -0.204,1.573 -0.069,1.6 0,1.6 0.069,1.6 0.204,1.573 0.332,1.52 0.446,1.444 0.544,1.346 0.62,1.232 0.673,1.104 0.7,0.969 0.7,0.9 0.7,0.831 0.673,0.696 0.62,0.568 0.544,0.454 0.446,0.356 0.332,0.28 0.204,0.227 0.069,0.2
Bottom Layer:
  pour cut-out: 0,-1.6 -0.069,-1.6 -0.204,-1.573 -0.332,-1.52 -0.446,-1.444 -0.544,-1.346 -0.62,-1.232 -0.673,-1.104 -0.7,-0.969 -0.7,-0.9 -0.7,-0.831 -0.673,-0.696 -0.62,-0.568 -0.544,-0.454 -0.446,-0.356 -0.332,-0.28 -0.204,-0.227 -0.069,-0.2 0,-0.2 0.069,-0.2 0.204,-0.227 0.332,-0.28 0.446,-0.356 0.544,-0.454 0.62,-0.568 0.673,-0.696 0.7,-0.831 0.7,-0.9 0.7,-0.969 0.673,-1.104 0.62,-1.232 0.544,-1.346 0.446,-1.444 0.332,-1.52 0.204,-1.573 0.069,-1.6
  pour cut-out: 0,0.2 -0.069,0.2 -0.204,0.227 -0.332,0.28 -0.446,0.356 -0.544,0.454 -0.62,0.568 -0.673,0.696 -0.7,0.831 -0.7,0.9 -0.7,0.969 -0.673,1.104 -0.62,1.232 -0.544,1.346 -0.446,1.444 -0.332,1.52 -0.204,1.573 -0.069,1.6 0,1.6 0.069,1.6 0.204,1.573 0.332,1.52 0.446,1.444 0.544,1.346 0.62,1.232 0.673,1.104 0.7,0.969 0.7,0.9 0.7,0.831 0.673,0.696 0.62,0.568 0.544,0.454 0.446,0.356 0.332,0.28 0.204,0.227 0.069,0.2
Top Overlay:
  lines w0.2: -2,-1.15 -2,-1.5 2,-1.5 2,-1.2 ; -2,1.2 -2,1.5 2,1.5 2,1.15
Top Solder:
  circle w0.1: c0,-0.9 r0.425
  circle w0.1: c0,0.9 r0.426
Multi-Layer:
  pour cut-out: 0,0.2 -0.069,0.2 -0.204,0.227 -0.332,0.28 -0.446,0.356 -0.544,0.454 -0.62,0.568 -0.673,0.696 -0.7,0.831 -0.7,0.9 -0.7,0.969 -0.673,1.104 -0.62,1.232 -0.544,1.346 -0.446,1.444 -0.332,1.52 -0.204,1.573 -0.069,1.6 0,1.6 0.069,1.6 0.204,1.573 0.332,1.52 0.446,1.444 0.544,1.346 0.62,1.232 0.673,1.104 0.7,0.969 0.7,0.9 0.7,0.831 0.673,0.696 0.62,0.568 0.544,0.454 0.446,0.356 0.332,0.28 0.204,0.227 0.069,0.2
  pour cut-out: 0,-1.6 -0.069,-1.6 -0.204,-1.573 -0.332,-1.52 -0.446,-1.444 -0.544,-1.346 -0.62,-1.232 -0.673,-1.104 -0.7,-0.969 -0.7,-0.9 -0.7,-0.831 -0.673,-0.696 -0.62,-0.568 -0.544,-0.454 -0.446,-0.356 -0.332,-0.28 -0.204,-0.227 -0.069,-0.2 0,-0.2 0.069,-0.2 0.204,-0.227 0.332,-0.28 0.446,-0.356 0.544,-0.454 0.62,-0.568 0.673,-0.696 0.7,-0.831 0.7,-0.9 0.7,-0.969 0.673,-1.104 0.62,-1.232 0.544,-1.346 0.446,-1.444 0.332,-1.52 0.204,-1.573 0.069,-1.6
3D body: height 2, standoff 1.2, extent -0.918,-0.898 0.875,0.898
3D body: height 1, standoff 0, extent -2.05,-1.5 2,1.5

## Jumper2 [mm]
pads (2):
  round 1.5 hole 0.9: 1(-1,0) 2(1,0)
Top Overlay:
  lines w0.2: -2.2,-1.2 2.2,-1.2 2.2,1.2 -2.2,1.2 -2.2,-1.2
Mechanical 1:
  lines w0.1: -2.2,-1.2 -2.2,1.2 2.2,1.2 2.2,-1.2 -2.2,-1.2
Mechanical 15:
  lines w0.05: -2.2,-1.2 -2.2,1.2 2.2,1.2 2.2,-1.2 -2.2,-1.2
  lines w0.1: -0.5,0 0.5,0 ; 0,-0.5 0,0.5
3D body "PLS2-2.step": height 6, standoff -2.8, extent -2,-1 2,1

## KLS1-NGFF01-3.2-M-G1U_42mm [mm]
pads (72):
  rect 0.3x1.524 smd: 1(-9.25,3.75) 2(-9,-3.75) 3(-8.75,3.75) 4(-8.5,-3.75) 5(-8.25,3.75) 6(-8,-3.75) 7(-7.75,3.75) 8(-7.5,-3.75) 9(-7.25,3.75) 10(-7,-3.75) 11(-6.75,3.75) 12(-6.5,-3.75) 13(-6.25,3.75) 14(-6,-3.75) 15(-5.75,3.75) 16(-5.5,-3.75) 17(-5.25,3.75) 18(-5,-3.75) 19(-4.75,3.75) 20(-4.5,-3.75) 21(-4.25,3.75) 22(-4,-3.75) 23(-3.75,3.75) 24(-3.5,-3.75) 25(-3.25,3.75) 26(-3,-3.75) 27(-2.75,3.75) 28(-2.5,-3.75) 29(-2.25,3.75) 30(-2,-3.75) 31(-1.75,3.75) 32(-1.5,-3.75) 33(-1.25,3.75) 34(-1,-3.75) 35(-0.75,3.75) 36(-0.5,-3.75) 37(-0.25,3.75) 38(0,-3.75) 39(0.25,3.75) 40(0.5,-3.75) 41(0.75,3.75) 42(1,-3.75) 43(1.25,3.75) 44(1.5,-3.75) 45(1.75,3.75) 46(2,-3.75) 47(2.25,3.75) 48(2.5,-3.75) 49(2.75,3.75) 50(3,-3.75) 51(3.25,3.75) 52(3.5,-3.75) 53(3.75,3.75) 54(4,-3.75) 55(4.25,3.75) 56(4.5,-3.75) 57(4.75,3.75) 58(5,-3.75) 67(7.25,3.75) 68(7.5,-3.75) 69(7.75,3.75) 70(8,-3.75) 71(8.25,3.75) 72(8.5,-3.75) 73(8.75,3.75) 74(9,-3.75) 75(9.25,3.75)
  rect 1.2x2.75 smd: 76(-10.35,3.025) 77(10.35,3.025)
  round 0 hole 1.1 unplated: 78(-10,-1.475)
  round 0 hole 1.6 unplated: 79(10,-1.475)
  round 5 hole 4.2: Bush(0,-42)
Top Overlay:
  lines w0.15: -11.3,-4.9 11.3,-4.9 11.3,4.9 -10.825,4.9 -11.3,4.425 -11.3,-4.9
Multi-Layer:
  pour cut-out: -10.9,-1.475 -10.9,-1.564 -10.865,-1.738 -10.798,-1.901 -10.699,-2.049 -10.574,-2.174 -10.426,-2.273 -10.263,-2.34 -10.089,-2.375 -10,-2.375 -9.911,-2.375 -9.737,-2.34 -9.574,-2.273 -9.426,-2.174 -9.301,-2.049 -9.202,-1.901 -9.135,-1.738 -9.1,-1.564 -9.1,-1.475 -9.1,-1.386 -9.135,-1.212 -9.202,-1.049 -9.301,-0.901 -9.426,-0.776 -9.574,-0.677 -9.737,-0.61 -9.911,-0.575 -10,-0.575 -10.089,-0.575 -10.263,-0.61 -10.426,-0.677 -10.574,-0.776 -10.699,-0.901 -10.798,-1.049 -10.865,-1.212 -10.9,-1.386
  pour cut-out: 8.8,-1.475 8.8,-1.593 8.846,-1.825 8.937,-2.043 9.068,-2.24 9.235,-2.407 9.432,-2.538 9.65,-2.629 9.882,-2.675 10,-2.675 10.118,-2.675 10.35,-2.629 10.568,-2.538 10.765,-2.407 10.932,-2.24 11.063,-2.043 11.154,-1.825 11.2,-1.593 11.2,-1.475 11.2,-1.357 11.154,-1.125 11.063,-0.907 10.932,-0.71 10.765,-0.543 10.568,-0.412 10.35,-0.321 10.118,-0.275 10,-0.275 9.882,-0.275 9.65,-0.321 9.432,-0.412 9.235,-0.543 9.068,-0.71 8.937,-0.907 8.846,-1.125 8.8,-1.357
3D body "1-2199230-5.stp": height 4.1, standoff -0.6, extent -10.95,-4.325 10.95,4.375

## L-KLS7-TS6606-5.0-180 [mm]
pads (4):
  round 1.8 hole 1: 1(-2.25,-1.25) 2(2.25,-1.25)
  round 2.2 hole 1.5: 3(3.5,1.25) 4(-3.5,1.25)
Top Overlay:
  lines w0.15: -4.9,-3.6 -4.9,-0.5 ; -4.9,1.9 -4.9,2.9 4.9,2.9 4.9,-3.6
Mechanical 15:
  lines w0.15: -4.9,-3.9 -4.9,2.9 4.9,2.9 4.9,-3.9 -4.9,-3.9
3D body "TS6-THT-RA_H-5.0.step": height 7, standoff -3.5, extent -4.2,-5 4.2,2.75

## LED_0603 [mm]
pads (2):
  rect 0.9x1 smd: 1(-0.8,0) 2(0.8,0)
Top Overlay:
  lines w0.2: -1.5,-0.75 1.5,-0.75 1.5,0.75 -1.5,0.75 -1.5,-0.75
  lines w0.3: 0.8,0.9 1.7,0.9 1.7,-0.9 0.9,-0.9
Mechanical 1:
  lines w0.1: -0.8,-0.4 0.8,-0.4 0.8,0.4 -0.8,0.4 -0.8,-0.4
Mechanical 15:
  lines w0.1: -0.475,0 0.475,0 ; 0,-0.475 0,0.475 ; -1.475,-0.75 1.5,-0.75 1.5,0.75 -1.475,0.75 -1.475,-0.75
3D body "User Library-LED_0603_R.STEP": height 0.6, standoff 0, extent -0.8,-0.4 0.8,0.4

## LP72431ANL [mm]
pads (24):
  rrect100% 2x0.76 smd: 1(-7.302,6.985) 2(-7.302,5.715) 3(-7.302,4.445) 4(-7.302,3.175) 5(-7.302,1.905) 6(-7.302,0.635) 7(-7.302,-0.635) 8(-7.302,-1.905) 9(-7.302,-3.175) 10(-7.302,-4.445) 11(-7.302,-5.715) 12(-7.302,-6.985) 13(7.302,-6.985) 14(7.302,-5.715)
  oval 2x0.76 smd: 15(7.302,-4.445) 16(7.302,-3.175) 17(7.302,-1.905) 18(7.302,-0.635) 19(7.302,0.635) 20(7.302,1.905) 21(7.302,3.175) 22(7.302,4.445) 23(7.302,5.715) 24(7.302,6.985)
Top Overlay:
  lines w0.15: -8.6,-9 -8.6,8.4 -8,9 8.6,9 8.6,-9 -8.6,-9
3D body "LP6062ANL.stp": height 6, standoff 0, extent -8,-8.8 8,8.8